# Altium footprint library Intelliclone.PcbLib: 372 footprints (part 5 of 24)
Each footprint in its own frame and in the unit in brackets; x right, y up, seen from the top. Pads: shape width x height; smd on the part's side, far side on the other; paste and mask are expansions set on the pad; w line width, h text height; cw(c..) or ccw(c..) is an arc to the next point about the centre after c.
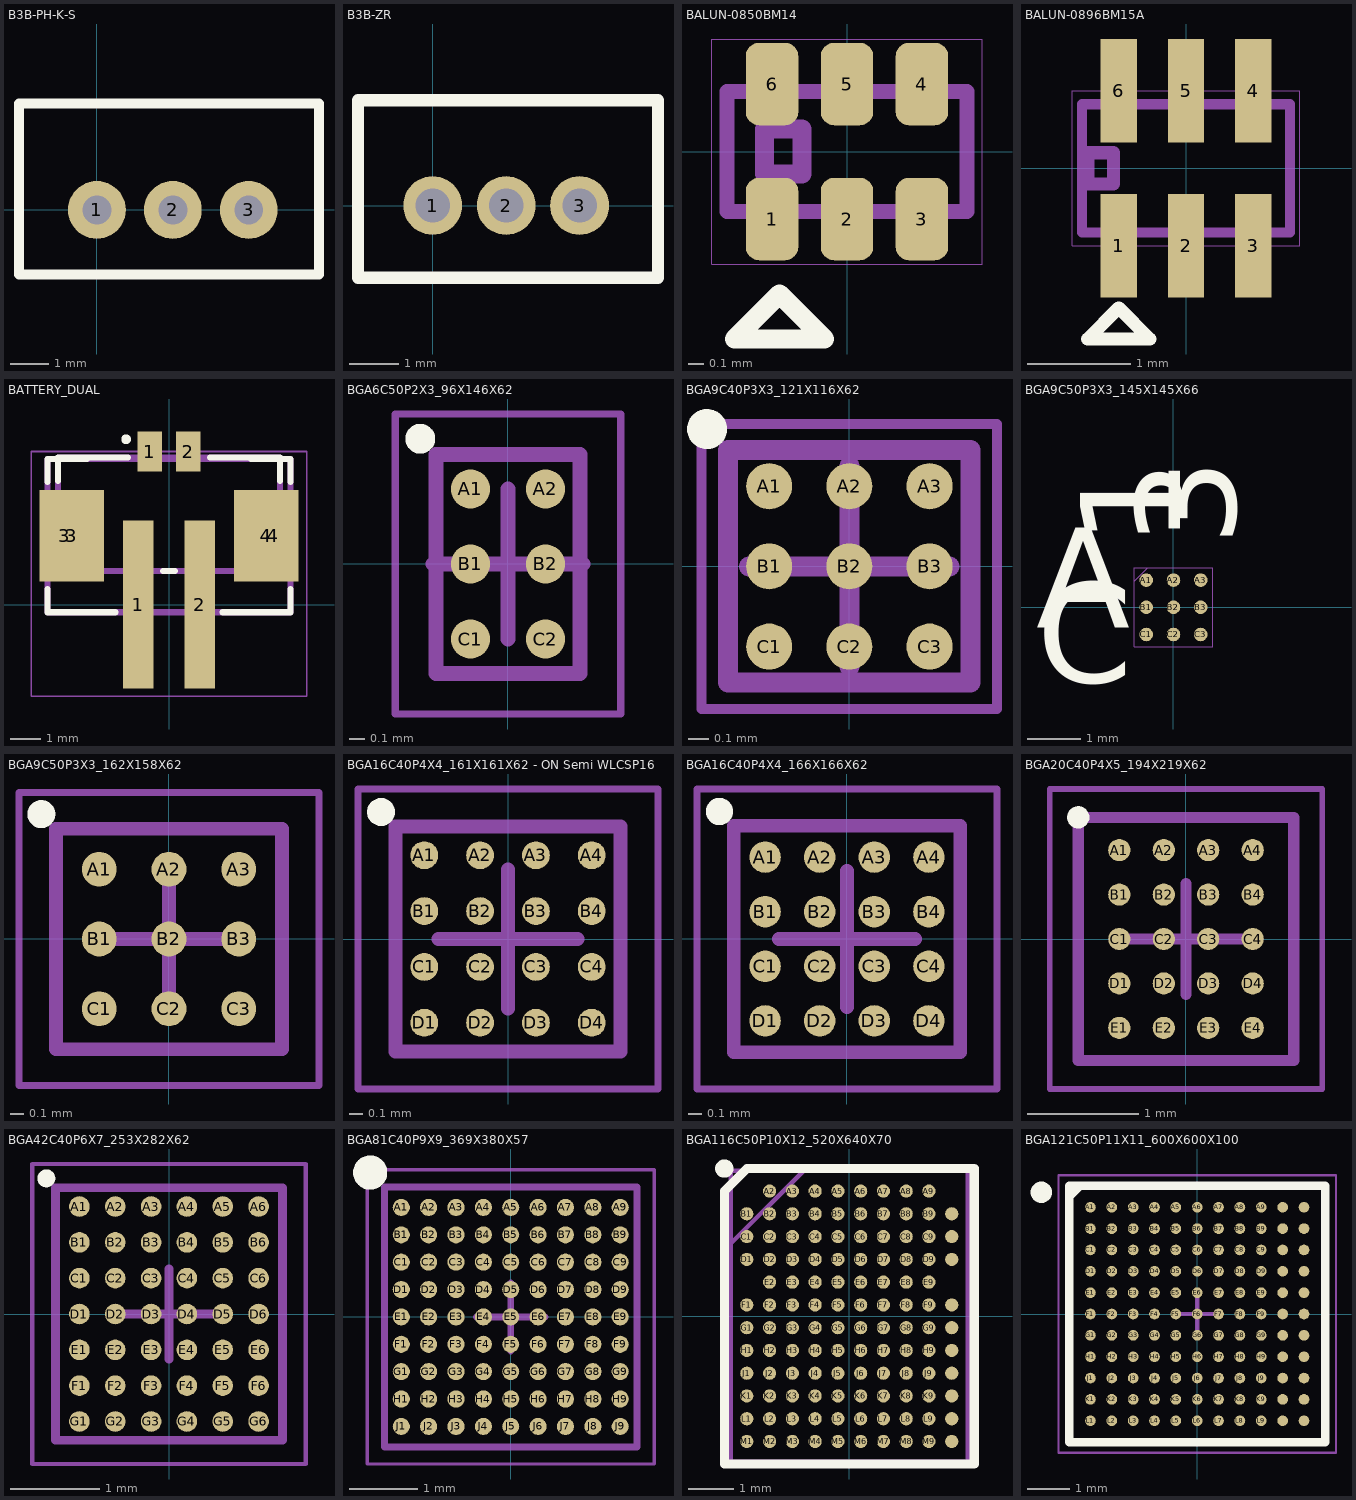
[diagram p4: the footprints below, top view; thin cyan lines are the x and y axes]

## B3B-PH-K-S [mil] "CONN HEADER PH TOP 3POS 2MM"
height 236.22
pads (3):
  round 60 hole 30: 1(0,0) 2(78.74,0) 3(157.48,0)
Top Overlay:
  lines w10: -80.71,-66.93 230.32,-66.93 230.32,110.24 -80.71,110.24 -80.71,-66.93
3D body "B3B-PH-K-S.STEP": height 236.22, standoff -133.86, extent -77.76,-66.93 233.27,110.24

## B3B-ZR [mm] "CONN HEADER ZR TOP 3POS 1.5MM"
height 6
pads (3):
  round 1.2 hole 0.7: 1(0,0) 2(1.5,0) 3(3,0)
Top Overlay:
  lines w0.254: -1.525,-1.475 -1.525,2.15 4.6,2.15 4.6,-1.475 -1.525,-1.475
3D body "B3B-ZR.STEP": height 4.5, standoff -2.7, extent -1.5,-1.3 4.5,2.2

## BALUN-0850BM14 [mm]
height 0.6
pads (6):
  rrect50% 0.35x0.55 smd: 1(-0.5,-0.45) 2(0,-0.45) 3(0.5,-0.45) 4(0.5,0.45) 5(0,0.45) 6(-0.5,0.45)
Top Overlay:
  lines w0.127: -0.75,-1.25 -0.45,-0.95 -0.15,-1.25 -0.75,-1.25
Mechanical 13:
  lines w0.1: -0.8,-0.4 -0.4,-0.4 0.8,-0.4 0.8,0.4 -0.8,0.4 -0.8,-0.4
Mechanical 16:
  lines w0.001: -0.9,-0.75 -0.9,0.75 0.9,0.75 0.9,-0.75 -0.9,-0.75
  lines w0.127: -0.55,-0.15 -0.3,-0.15 -0.3,0.15 -0.55,0.15 -0.55,-0.15
3D body: height 0.84, standoff 0, extent -0.8,-0.4 0.8,0.4

## BALUN-0896BM15A [mm]
pads (6):
  rect 0.35x1 smd: 1(-0.65,-0.75) 2(0,-0.75) 3(0.65,-0.75) 4(0.65,0.75) 5(0,0.75) 6(-0.65,0.75)
Top Overlay:
  lines w0.127: -0.95,-1.65 -0.35,-1.65 -0.65,-1.35 -0.95,-1.65
Mechanical 13:
  lines w0.1: -1.005,-0.62 1.005,-0.62 1.005,0.62 ; -1.005,-0.608 -1.005,0.62 0.993,0.62
Mechanical 16:
  lines w0.001: -1.1,-0.75 1.1,-0.75 1.1,0.75 -1.1,0.75 -1.1,-0.75
  lines w0.127: -0.95,-0.15 -0.95,0.15 -0.7,0.15 -0.7,-0.15 -0.95,-0.15
3D body: height 0.84, standoff 0, extent -1.005,-0.62 1.005,0.62

## BATTERY_DUAL [mm] "Dual pad battery connector"
pads (8):
  rect 1x5.5 smd: 1(-1,0) 2(1,0)
  rect 0.8x1.3 smd: 1(-0.625,5) 2(0.625,5)
  rect 1.6x3 smd: 3(-3.4,2.25) 4(3.4,2.25)
  rect 2.1x3 smd: 3(-3.175,2.25) 4(3.175,2.25)
Top Overlay:
  circle w0.2: c-1.4,5.4 r0.06
  lines w0.2: -3.975,0.5 -3.975,-0.25 -1.75,-0.25 ; -3.975,4 -3.975,4.75 -2.675,4.75 ; -3.625,4.039 -3.625,4.8 -1.337,4.8 ; -0.2,1.1 0.2,1.1 ; 1.337,4.8 3.625,4.8 3.625,4.039 ; 1.75,-0.25 3.975,-0.25 3.975,0.5 ; 2.675,4.75 3.975,4.75 3.975,4
Mechanical 4:
  lines w0.2: -3.975,-0.25 -3.975,4.75 ; -3.975,-0.25 3.975,-0.25 ; -3.975,-0.25 -3.975,4.75 ; -3.975,-0.25 3.975,-0.25 ; -3.975,4.75 3.975,4.75 ; -3.975,4.75 3.975,4.75 ; 3.975,-0.25 3.975,4.75 ; 3.975,-0.25 3.975,4.75
Mechanical 15:
  lines w0.05: -4.5,-3 -4.5,5 4.5,5 4.5,-3 -4.5,-3
  lines w0.2: -3.625,1.1 3.625,1.1 3.625,4.8 -3.625,4.8 -3.625,1.1
3D body "533980271.stp": height 4.71, standoff -0.03, extent -3.825,1.1 3.825,5.3

## BGA6C50P2X3_96X146X62 [mm] "BGA, 6-Leads, Body 0.96x1.46mmx0.63mm, Pitch 0.50mm"
height 0.63
pads (6):
  round 0.26 smd: A1(-0.25,0.5) A2(0.25,0.5) B1(-0.25,0) B2(0.25,0) C1(-0.25,-0.5) C2(0.25,-0.5)
Top Overlay:
  circle w0.1: c-0.585,0.835 r0.05
Mechanical 13:
  lines w0.1: -0.48,-0.73 0.48,-0.73 0.48,0.73 -0.48,0.73 -0.48,-0.73
Mechanical 15:
  lines w0.05: -0.75,-1 0.75,-1 0.75,1 -0.75,1 -0.75,-1
  lines w0.1: -0.5,0 0.5,0 ; 0,-0.5 0,0.5
3D body "BGA6C50P2X3_96X146X62.step": height 0.63, standoff 0, extent -0.48,-0.73 0.48,0.73

## BGA9C40P3X3_121X116X62 [mm] "BGA, 9-Leads, Body 1.21x1.16mmx0.63mm, Pitch 0.40mm"
height 0.63
pads (9):
  round 0.23 smd paste+0.022 mask+0.04: A1(-0.4,0.4) A2(0,0.4) A3(0.4,0.4) B1(-0.4,0) B2(0,0) B3(0.4,0) C1(-0.4,-0.4) C2(0,-0.4) C3(0.4,-0.4)
Top Overlay:
  circle w0.1: c-0.71,0.685 r0.05
Mechanical 13:
  lines w0.1: -0.605,-0.58 -0.605,0.58 0.605,0.58 0.605,-0.58 -0.605,-0.58
Mechanical 15:
  lines w0.05: -0.737,-0.711 -0.737,0.711 0.737,0.711 0.737,-0.711 -0.737,-0.711
  lines w0.1: -0.5,0 0.5,0 ; 0,-0.5 0,0.5
3D body: height 0.63, standoff 0.2, extent -0.605,-0.58 0.605,0.58

## BGA9C50P3X3_145X145X66 [mil]
pads (9):
  round 10 smd: A1(-20,20) A2(0,20) A3(20,20) B1(-20,0) B2(0,0) B3(20,0) C1(-20,-20) C2(0,-20) C3(20,-20)
Top Overlay:
  text "A" at -101.11,-14.95 h73.82
  text "C" at -100.49,-55.52 h73.82
  text "1" at 5.11,45.38 h73.82
  text "3" at 45.68,44.97 h73.82
Mechanical 4:
  lines w0: -29,-29 29,-29 ; -29,-29 -29,29 ; -29,-29 29,-29 ; -29,-29 -29,29 ; -29,29 29,29 ; -29,29 29,29 ; 29,-29 29,29 ; 29,-29 29,29 ; -29,19 -19,29 -29,19
  text "A" at -101.14,-14.95 h73.82
  text "C" at -100.87,-55.69 h73.82
  text "1" at 5.1,45.2 h73.82
  text "3" at 45.79,45.11 h73.82
  text "A" at -101.14,-14.95 h73.82
  text "C" at -100.87,-55.69 h73.82
  text "1" at 5.1,45.2 h73.82
  text "3" at 45.79,45.11 h73.82

## BGA9C50P3X3_162X158X62 [mm] "BGA, 9-Leads, Body 1.62x1.58mmx0.63mm, Pitch 0.50mm"
height 0.63
pads (9):
  round 0.25 smd: A1(-0.5,0.5) A2(0,0.5) A3(0.5,0.5) B1(-0.5,0) B2(0,0) B3(0.5,0) C1(-0.5,-0.5) C2(0,-0.5) C3(0.5,-0.5)
Top Overlay:
  circle w0.1: c-0.915,0.895 r0.05
Mechanical 13:
  lines w0.1: -0.81,-0.79 0.81,-0.79 0.81,0.79 -0.81,0.79 -0.81,-0.79
Mechanical 15:
  lines w0.05: -1.075,-1.05 1.075,-1.05 1.075,1.05 -1.075,1.05 -1.075,-1.05
  lines w0.1: -0.5,0 0.5,0 ; 0,-0.5 0,0.5
3D body: height 0.63, standoff 0.3, extent -0.81,-0.79 0.81,0.79

## BGA16C40P4X4_161X161X62 - ON Semi WLCSP16 [mm] "BGA, 16-Leads, Body 1.61x1.61mmx0.63mm, Pitch 0.40mm"
height 0.63
pads (16):
  round 0.2 smd: A1(-0.6,0.6) A2(-0.2,0.6) A3(0.2,0.6) A4(0.6,0.6) B1(-0.6,0.2) B2(-0.2,0.2) B3(0.2,0.2) B4(0.6,0.2) C1(-0.6,-0.2) C2(-0.2,-0.2) C3(0.2,-0.2) C4(0.6,-0.2) D1(-0.6,-0.6) D2(-0.2,-0.6) D3(0.2,-0.6) D4(0.6,-0.6)
Top Overlay:
  circle w0.1: c-0.91,0.91 r0.05
Mechanical 13:
  lines w0.1: -0.805,-0.805 -0.805,0.805 0.805,0.805 0.805,-0.805 -0.805,-0.805
Mechanical 15:
  lines w0.05: -1.075,-1.075 -1.075,1.075 1.075,1.075 1.075,-1.075 -1.075,-1.075
  lines w0.1: -0.5,0 0.5,0 ; 0,-0.5 0,0.5
3D body "BGA16C40P4X4_161X161X62 - ON Semi WLCSP16.step": height 0.63, standoff 0, extent -0.805,-0.805 0.805,0.805

## BGA16C40P4X4_166X166X62 [mm] "BGA, 16-Leads, Body 1.66x1.66mmx0.63mm, Pitch 0.40mm"
height 0.63
pads (16):
  round 0.23 smd paste+0.022 mask+0.04: A1(-0.6,0.6) A2(-0.2,0.6) A3(0.2,0.6) A4(0.6,0.6) B1(-0.6,0.2) B2(-0.2,0.2) B3(0.2,0.2) B4(0.6,0.2) C1(-0.6,-0.2) C2(-0.2,-0.2) C3(0.2,-0.2) C4(0.6,-0.2) D1(-0.6,-0.6) D2(-0.2,-0.6) D3(0.2,-0.6) D4(0.6,-0.6)
Top Overlay:
  circle w0.1: c-0.935,0.935 r0.05
Mechanical 13:
  lines w0.1: -0.83,-0.83 -0.83,0.83 0.83,0.83 0.83,-0.83 -0.83,-0.83
Mechanical 15:
  lines w0.05: -1.1,-1.1 -1.1,1.1 1.1,1.1 1.1,-1.1 -1.1,-1.1
  lines w0.1: -0.5,0 0.5,0 ; 0,-0.5 0,0.5
3D body: height 0.63, standoff 0.2, extent -0.83,-0.83 0.83,0.83

## BGA20C40P4X5_194X219X62 [mm] "BGA, 20-Leads, Body 1.94x2.19mmx0.63mm, Pitch 0.40mm"
height 0.63
pads (20):
  round 0.2 smd mask+0.05: A1(-0.6,0.8) A2(-0.2,0.8) A3(0.2,0.8) A4(0.6,0.8) B1(-0.6,0.4) B2(-0.2,0.4) B3(0.2,0.4) B4(0.6,0.4) C1(-0.6,0) C2(-0.2,0) C3(0.2,0) C4(0.6,0) D1(-0.6,-0.4) D2(-0.2,-0.4) D3(0.2,-0.4) D4(0.6,-0.4) E1(-0.6,-0.8) E2(-0.2,-0.8) E3(0.2,-0.8) E4(0.6,-0.8)
Top Overlay:
  circle w0.1: c-0.97,1.095 r0.05
Mechanical 13:
  lines w0.1: -0.97,-1.095 -0.97,1.095 0.97,1.095 0.97,-1.095 -0.97,-1.095
Mechanical 15:
  lines w0.05: -1.225,-1.35 -1.225,1.35 1.225,1.35 1.225,-1.35 -1.225,-1.35
  lines w0.1: -0.5,0 0.5,0 ; 0,-0.5 0,0.5
3D body: height 0.63, standoff 0.3, extent -0.97,-1.095 0.97,1.095

## BGA42C40P6X7_253X282X62 [mm] "BGA, 42-Leads, Body 2.53x2.82mmx0.63mm, Pitch 0.40mm"
height 0.63
pads (42):
  round 0.23 smd paste+0.01 mask+0.05: A1(-1,1.2) A2(-0.6,1.2) A3(-0.2,1.2) A4(0.2,1.2) A5(0.6,1.2) A6(1,1.2) B1(-1,0.8) B2(-0.6,0.8) B3(-0.2,0.8) B4(0.2,0.8) B5(0.6,0.8) B6(1,0.8) C1(-1,0.4) C2(-0.6,0.4) C3(-0.2,0.4) C4(0.2,0.4) C5(0.6,0.4) C6(1,0.4) D1(-1,0) D2(-0.6,0) D3(-0.2,0) D4(0.2,0) D5(0.6,0) D6(1,0) E1(-1,-0.4) E2(-0.6,-0.4) E3(-0.2,-0.4) E4(0.2,-0.4) E5(0.6,-0.4) E6(1,-0.4) F1(-1,-0.8) F2(-0.6,-0.8) F3(-0.2,-0.8) F4(0.2,-0.8) F5(0.6,-0.8) F6(1,-0.8) G1(-1,-1.2) G2(-0.6,-1.2) G3(-0.2,-1.2) G4(0.2,-1.2) G5(0.6,-1.2) G6(1,-1.2)
Top Overlay:
  circle w0.1: c-1.37,1.515 r0.05
Mechanical 13:
  lines w0.1: -1.265,-1.41 1.265,-1.41 1.265,1.41 -1.265,1.41 -1.265,-1.41
Mechanical 15:
  lines w0.05: -1.525,-1.675 1.525,-1.675 1.525,1.675 -1.525,1.675 -1.525,-1.675
  lines w0.1: -0.5,0 0.5,0 ; 0,-0.5 0,0.5
3D body: height 0.63, standoff 0.3, extent -1.265,-1.41 1.265,1.41

## BGA81C40P9X9_369X380X57 [mm] "BGA, 81-Leads, Body 3.69x3.80mmx0.57mm, Pitch 0.40mm"
height 0.57
pads (81):
  round 0.25 smd: A1(-1.6,1.6) A2(-1.2,1.6) A3(-0.8,1.6) A4(-0.4,1.6) A5(0,1.6) A6(0.4,1.6) A7(0.8,1.6) A8(1.2,1.6) A9(1.6,1.6) B1(-1.6,1.2) B2(-1.2,1.2) B3(-0.8,1.2) B4(-0.4,1.2) B5(0,1.2) B6(0.4,1.2) B7(0.8,1.2) B8(1.2,1.2) B9(1.6,1.2) C1(-1.6,0.8) C2(-1.2,0.8) C3(-0.8,0.8) C4(-0.4,0.8) C5(0,0.8) C6(0.4,0.8) C7(0.8,0.8) C8(1.2,0.8) C9(1.6,0.8) D1(-1.6,0.4) D2(-1.2,0.4) D3(-0.8,0.4) D4(-0.4,0.4) D5(0,0.4) D6(0.4,0.4) D7(0.8,0.4) D8(1.2,0.4) D9(1.6,0.4) E1(-1.6,0) E2(-1.2,0) E3(-0.8,0) E4(-0.4,0) E5(0,0) E6(0.4,0) E7(0.8,0) E8(1.2,0) E9(1.6,0) F1(-1.6,-0.4) F2(-1.2,-0.4) F3(-0.8,-0.4) F4(-0.4,-0.4) F5(0,-0.4) F6(0.4,-0.4) F7(0.8,-0.4) F8(1.2,-0.4) F9(1.6,-0.4) G1(-1.6,-0.8) G2(-1.2,-0.8) G3(-0.8,-0.8) G4(-0.4,-0.8) G5(0,-0.8) G6(0.4,-0.8) G7(0.8,-0.8) G8(1.2,-0.8) G9(1.6,-0.8) H1(-1.6,-1.2) H2(-1.2,-1.2) H3(-0.8,-1.2) H4(-0.4,-1.2) H5(0,-1.2) H6(0.4,-1.2) H7(0.8,-1.2) H8(1.2,-1.2) H9(1.6,-1.2) J1(-1.6,-1.6) J2(-1.2,-1.6) J3(-0.8,-1.6) J4(-0.4,-1.6) J5(0,-1.6) J6(0.4,-1.6) J7(0.8,-1.6) J8(1.2,-1.6) J9(1.6,-1.6)
Top Overlay:
  circle w0.25: c-2.055,2.11 r0.125
Mechanical 13:
  lines w0.1: -1.845,-1.9 1.845,-1.9 1.845,1.9 -1.845,1.9 -1.845,-1.9
Mechanical 15:
  lines w0.05: -2.1,-2.15 2.1,-2.15 2.1,2.15 -2.1,2.15 -2.1,-2.15
  lines w0.1: -0.5,0 0.5,0 ; 0,-0.5 0,0.5
3D body "BGA81C40P9X9_369X380X57.step": height 0.57, standoff 0, extent -1.845,-1.9 1.845,1.9

## BGA116C50P10X12_520X640X70 [mm]
pads (116):
  round 0.29 smd: A2(-1.75,2.75) A3(-1.25,2.75) A4(-0.75,2.75) A5(-0.25,2.75) A6(0.25,2.75) A7(0.75,2.75) A8(1.25,2.75) A9(1.75,2.75) B1(-2.25,2.25) B2(-1.75,2.25) B3(-1.25,2.25) B4(-0.75,2.25) B5(-0.25,2.25) B6(0.25,2.25) B7(0.75,2.25) B8(1.25,2.25) B9(1.75,2.25) B10(2.25,2.25) C1(-2.25,1.75) C2(-1.75,1.75) C3(-1.25,1.75) C4(-0.75,1.75) C5(-0.25,1.75) C6(0.25,1.75) C7(0.75,1.75) C8(1.25,1.75) C9(1.75,1.75) C10(2.25,1.75) D1(-2.25,1.25) D2(-1.75,1.25) D3(-1.25,1.25) D4(-0.75,1.25) D5(-0.25,1.25) D6(0.25,1.25) D7(0.75,1.25) D8(1.25,1.25) D9(1.75,1.25) D10(2.25,1.25) E2(-1.75,0.75) E3(-1.25,0.75) E4(-0.75,0.75) E5(-0.25,0.75) E6(0.25,0.75) E7(0.75,0.75) E8(1.25,0.75) E9(1.75,0.75) F1(-2.25,0.25) F2(-1.75,0.25) F3(-1.25,0.25) F4(-0.75,0.25) F5(-0.25,0.25) F6(0.25,0.25) F7(0.75,0.25) F8(1.25,0.25) F9(1.75,0.25) F10(2.25,0.25) G1(-2.25,-0.25) G2(-1.75,-0.25) G3(-1.25,-0.25) G4(-0.75,-0.25) G5(-0.25,-0.25) G6(0.25,-0.25) G7(0.75,-0.25) G8(1.25,-0.25) G9(1.75,-0.25) G10(2.25,-0.25) H1(-2.25,-0.75) H2(-1.75,-0.75) H3(-1.25,-0.75) H4(-0.75,-0.75) H5(-0.25,-0.75) H6(0.25,-0.75) H7(0.75,-0.75) H8(1.25,-0.75) H9(1.75,-0.75) H10(2.25,-0.75) J1(-2.25,-1.25) J2(-1.75,-1.25) J3(-1.25,-1.25) J4(-0.75,-1.25) J5(-0.25,-1.25) J6(0.25,-1.25) J7(0.75,-1.25) J8(1.25,-1.25) J9(1.75,-1.25) J10(2.25,-1.25) K1(-2.25,-1.75) K2(-1.75,-1.75) K3(-1.25,-1.75) K4(-0.75,-1.75) K5(-0.25,-1.75) K6(0.25,-1.75) K7(0.75,-1.75) K8(1.25,-1.75) K9(1.75,-1.75) K10(2.25,-1.75) L1(-2.25,-2.25) L2(-1.75,-2.25) L3(-1.25,-2.25) L4(-0.75,-2.25) L5(-0.25,-2.25) L6(0.25,-2.25) L7(0.75,-2.25) L8(1.25,-2.25) L9(1.75,-2.25) L10(2.25,-2.25) M1(-2.25,-2.75) M2(-1.75,-2.75) M3(-1.25,-2.75) M4(-0.75,-2.75) M5(-0.25,-2.75) M6(0.25,-2.75) M7(0.75,-2.75) M8(1.25,-2.75) M9(1.75,-2.75) M10(2.25,-2.75)
Top Overlay:
  circle w0.2: c-2.745,3.245 r0.1
  lines w0.2: -2.745,-3.245 2.745,-3.245 2.745,3.245 -2.25,3.245 -2.745,2.75 -2.745,-3.245
Mechanical 15:
  lines w0.1: -2.6,1.6 -1,3.2 ; -2.6,-3.2 2.6,-3.2 2.6,3.2 -2.6,3.2 -2.6,-3.2
3D body "CY8C6347BZI-BLD53.stp": height 0.7, standoff 0, extent -2.6,-3.2 2.6,3.2

## BGA121C50P11X11_600X600X100 [mm] "BGA, 121-Leads, Body 6.00x6.00mmx1.00mm, Pitch 0.50mm"
height 1
pads (121):
  round 0.25 smd: A1(-2.5,2.5) A2(-2,2.5) A3(-1.5,2.5) A4(-1,2.5) A5(-0.5,2.5) A6(0,2.5) A7(0.5,2.5) A8(1,2.5) A9(1.5,2.5) A10(2,2.5) A11(2.5,2.5) B1(-2.5,2) B2(-2,2) B3(-1.5,2) B4(-1,2) B5(-0.5,2) B6(0,2) B7(0.5,2) B8(1,2) B9(1.5,2) B10(2,2) B11(2.5,2) C1(-2.5,1.5) C2(-2,1.5) C3(-1.5,1.5) C4(-1,1.5) C5(-0.5,1.5) C6(0,1.5) C7(0.5,1.5) C8(1,1.5) C9(1.5,1.5) C10(2,1.5) C11(2.5,1.5) D1(-2.5,1) D2(-2,1) D3(-1.5,1) D4(-1,1) D5(-0.5,1) D6(0,1) D7(0.5,1) D8(1,1) D9(1.5,1) D10(2,1) D11(2.5,1) E1(-2.5,0.5) E2(-2,0.5) E3(-1.5,0.5) E4(-1,0.5) E5(-0.5,0.5) E6(0,0.5) E7(0.5,0.5) E8(1,0.5) E9(1.5,0.5) E10(2,0.5) E11(2.5,0.5) F1(-2.5,0) F2(-2,0) F3(-1.5,0) F4(-1,0) F5(-0.5,0) F6(0,0) F7(0.5,0) F8(1,0) F9(1.5,0) F10(2,0) F11(2.5,0) G1(-2.5,-0.5) G2(-2,-0.5) G3(-1.5,-0.5) G4(-1,-0.5) G5(-0.5,-0.5) G6(0,-0.5) G7(0.5,-0.5) G8(1,-0.5) G9(1.5,-0.5) G10(2,-0.5) G11(2.5,-0.5) H1(-2.5,-1) H2(-2,-1) H3(-1.5,-1) H4(-1,-1) H5(-0.5,-1) H6(0,-1) H7(0.5,-1) H8(1,-1) H9(1.5,-1) H10(2,-1) H11(2.5,-1) J1(-2.5,-1.5) J2(-2,-1.5) J3(-1.5,-1.5) J4(-1,-1.5) J5(-0.5,-1.5) J6(0,-1.5) J7(0.5,-1.5) J8(1,-1.5) J9(1.5,-1.5) J10(2,-1.5) J11(2.5,-1.5) K1(-2.5,-2) K2(-2,-2) K3(-1.5,-2) K4(-1,-2) K5(-0.5,-2) K6(0,-2) K7(0.5,-2) K8(1,-2) K9(1.5,-2) K10(2,-2) K11(2.5,-2) L1(-2.5,-2.5) L2(-2,-2.5) L3(-1.5,-2.5) L4(-1,-2.5) L5(-0.5,-2.5) L6(0,-2.5) L7(0.5,-2.5) L8(1,-2.5) L9(1.5,-2.5) L10(2,-2.5) L11(2.5,-2.5)
Top Overlay:
  circle w0.25: c-3.65,2.85 r0.125
  region: -2.742,3 -3,2.742 -3,3
  lines w0.2: -3,2.742 -2.742,3 ; -3,-3 -3,3 3,3 3,-3 -3,-3
Mechanical 13:
  lines w0.1: -3,-3 -3,3 3,3 3,-3 -3,-3
Mechanical 15:
  lines w0.05: -3.25,-3.25 -3.25,3.25 3.25,3.25 3.25,-3.25 -3.25,-3.25
  lines w0.1: -0.5,0 0.5,0 ; 0,-0.5 0,0.5
3D body "BGA121C50P11X11_600X600X100.step": height 1, standoff 0, extent -3,-3 3,3